# Altium footprint library Lib.PcbLib: 177 footprints (part 5 of 12)
Each footprint in its own frame and in the unit in brackets; x right, y up, seen from the top. Pads: shape width x height; smd on the part's side, far side on the other; paste and mask are expansions set on the pad; w line width, h text height; cw(c..) or ccw(c..) is an arc to the next point about the centre after c.
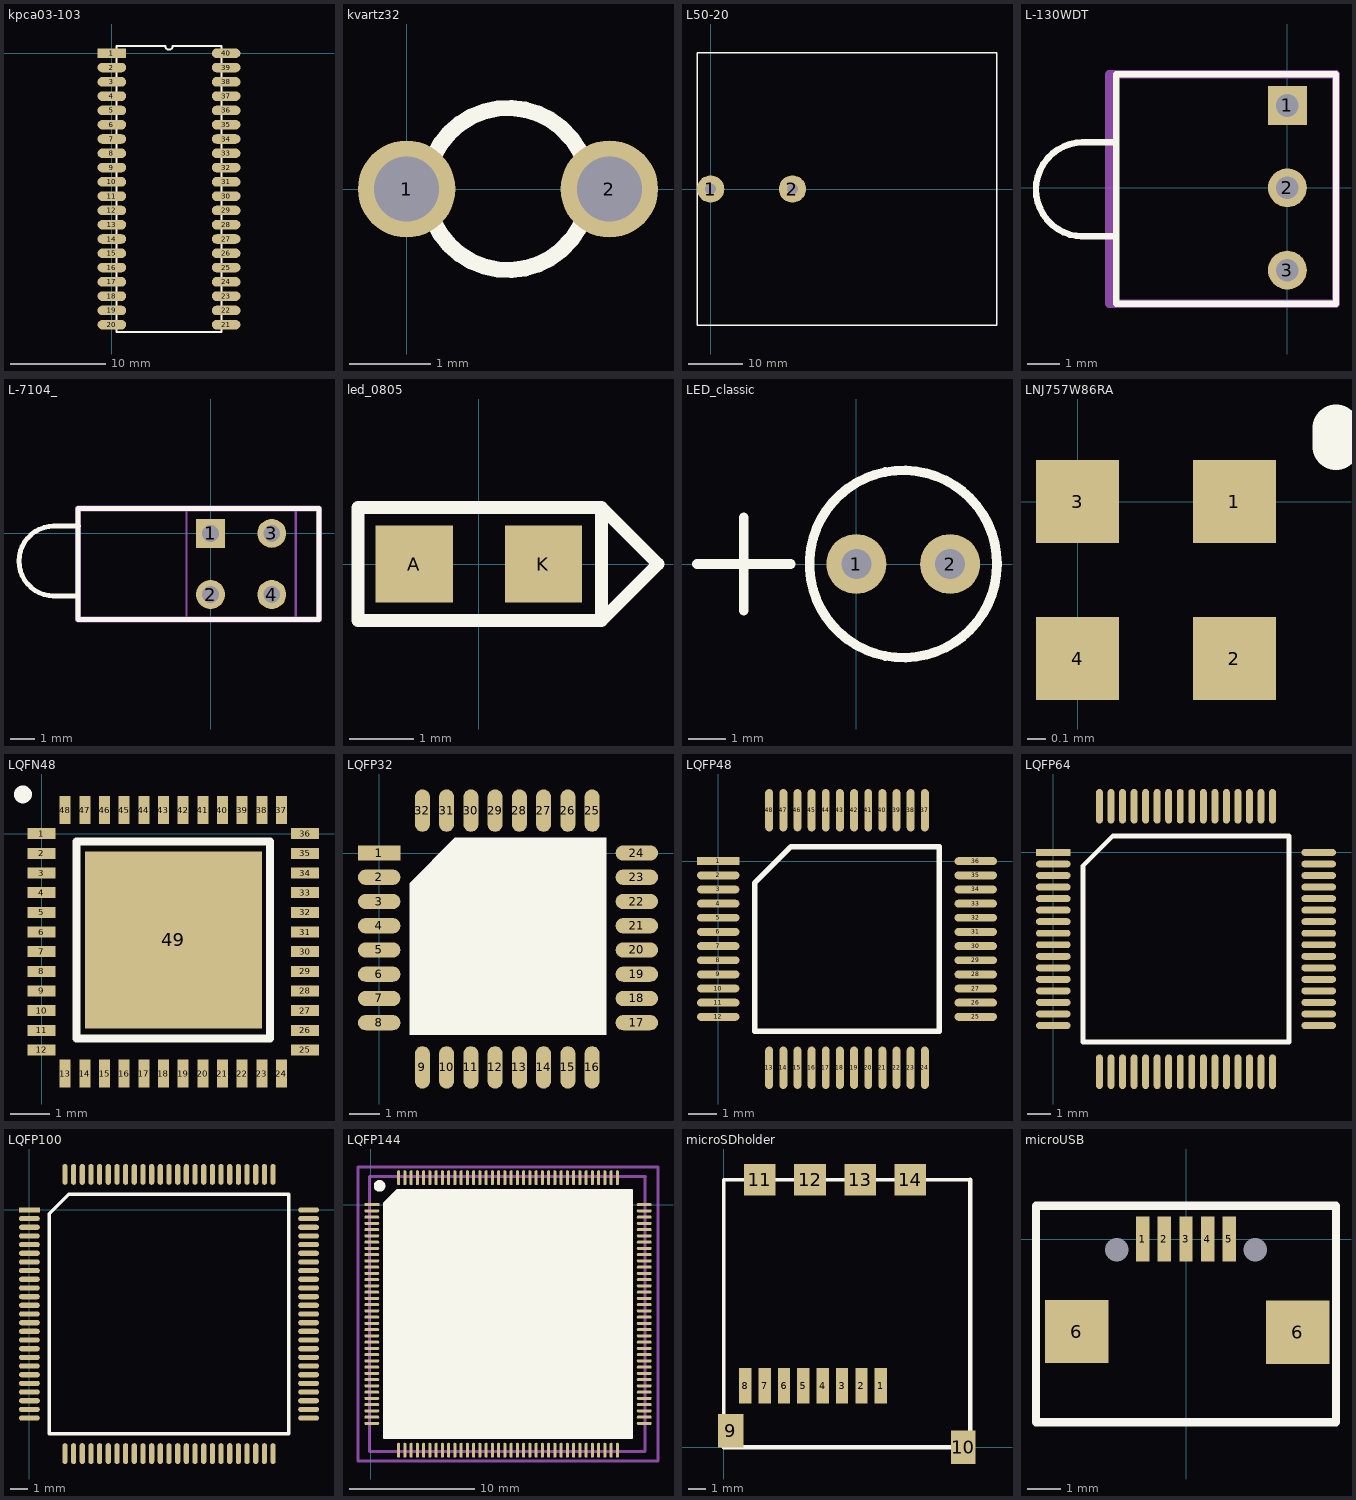
[diagram p4: the footprints below, top view; thin cyan lines are the x and y axes]

## kpca03-103 [mm]
pads (40):
  rect 3x1 smd: 1(0,0)
  oval 3x1 smd: 2(0,-1.5) 3(0,-3) 4(0,-4.5) 5(0,-6) 6(0,-7.5) 7(0,-9) 8(0,-10.5) 9(0,-12) 10(0,-13.5) 11(0,-15) 12(0,-16.5) 13(0,-18) 14(0,-19.5) 15(0,-21) 16(0,-22.5) 17(0,-24) 18(0,-25.5) 19(0,-27) 20(0,-28.5) 21(12,-28.5) 22(12,-27) 23(12,-25.5) 24(12,-24) 25(12,-22.5) 26(12,-21) 27(12,-19.5) 28(12,-18) 29(12,-16.5) 30(12,-15) 31(12,-13.5) 32(12,-12) 33(12,-10.5) 34(12,-9) 35(12,-7.5) 36(12,-6) 37(12,-4.5) 38(12,-3) 39(12,-1.5) 40(12,0)
Top Overlay:
  lines w0.2: 0.5,-29.25 0.5,0.75 5.625,0.75 ccw(c6,0.75) 6.375,0.75 11.5,0.75 11.5,-29.25 0.5,-29.25

## kvartz32 [mm]
pads (2):
  round 1.2 hole 0.8: 1(0,0) 2(2.5,0)
Top Overlay:
  circle w0.2: c1.25,0 r1

## L50-20 [mm]
pads (2):
  round 5 hole 2: 1(0,0) 2(15,0)
Top Overlay:
  lines w0.254: -2.5,-25 52.5,-25 52.5,25 -2.5,25 -2.5,0 -2.5,-25

## L-130WDT [mm]
pads (3):
  rect 1.2x1.2 hole 0.7: 1(0,2.54)
  round 1.2 hole 0.7: 2(0,0) 3(0,-2.54)
Top Overlay:
  lines w0.2: -6.35,-1.5 -5.3,-1.5 ; -6.325,1.4 -5.275,1.4 ; -6.3,-1.5 cw(c-6.3,-0.05) -6.3,1.4 ; -5.275,-3.57 1.5,-3.57 1.5,3.5 -5.275,3.5 -5.275,-3.57
Mechanical 3:
  lines w0.254: -5.5,-3.575 1.5,-3.575 1.5,3.5 -5.5,3.5 -5.5,-3.575
Mechanical 13:
  lines w0.1: -5.275,-3.57 -5.275,3.425 1.5,3.425 1.5,-3.57 -5.275,-3.57
Mechanical 15:
  lines w0.1: -0.4,0 0.4,0 ; 0,-0.4 0,0.4 ; -5.425,-3.57 1.5,-3.57 1.5,3.5 -5.425,3.5 -5.425,-3.57
3D body: height 3.86, standoff 0.97, extent -7.78,-1.447 -5.08,1.447
3D body: height 5, standoff 0, extent -5.08,-3.5 1.27,3.5

## L-7104_ [mm]
pads (4):
  rect 1.2x1.2 hole 0.7: 1(0,0)
  round 1.2 hole 0.7: 2(0,-2.54) 3(2.54,0) 4(2.54,-2.54)
Top Overlay:
  lines w0.2: -6.55,-2.6 -5.5,-2.6 ; -6.525,0.3 -5.475,0.3 ; -6.5,-2.6 cw(c-6.5,-1.15) -6.5,0.3 ; -5.5,-3.57 4.5,-3.57 4.5,1.03 -5.5,1.03 -5.5,-3.57
Mechanical 3:
  lines w0.254: -5.5,-3.575 4.5,-3.575 4.5,1.025 -5.5,1.025 -5.5,-3.575
Mechanical 13:
  lines w0.1: -5.5,-3.57 -5.5,1.03 4.5,1.03 4.5,-3.57 -5.5,-3.57
Mechanical 15:
  lines w0.1: -0.4,0 0.4,0 ; 0,-0.4 0,0.4 ; -1,-3.57 3.54,-3.57 3.54,1.03 -1,1.03 -1,-3.57
3D body "User Library-L-7104MD-2GD.step": height 9.65, standoff -3.68, extent -7.23,-3.45 3.7,0.85

## led_0805 [mm]
pads (2):
  rect 1.2x1.2 smd: A(-1,0) K(1,0)
Top Overlay:
  lines w0.2: 2.75,0 2.775,0 ; 1.9,-0.875 2.775,0 ; 1.9,-0.875 1.9,-0.875 ; 1.9,-0.875 1.9,0.875 ; 1.9,-0.875 -1.875,-0.875 -1.875,-0.437 -1.875,0.437 -1.875,0.875 1.9,0.875 ; 1.9,0.875 2.775,0 ; 1.9,0.875 1.9,0.875
3D body "User Library-led_0805.step": height 1.1, standoff 0, extent -1.01,-0.625 1.01,0.625

## LED_classic [mm]
pads (2):
  round 1.6 hole 0.8: 1(0,0) 2(2.5,0)
Top Overlay:
  circle w0.254: c1.25,0 r2.5
  lines w0.254: -4.25,0 -1.75,0 ; -3,-1.25 -3,1.25
3D body "CircuitWorks-5MM LED RED.step": height 12.6, standoff -1, extent -1.293,-2.55 3.793,2.55

## LNJ757W86RA [mm]
pads (4):
  rect 0.45x0.45 smd: 1(0.85,0) 2(0.85,-0.85) 3(0,0) 4(0,-0.85)
Top Overlay:
  lines w0.254: 1.4,0.3 1.4,0.4
3D body: height 0.25, standoff 0, extent -0.125,-1.075 0.975,0.225

## LQFN48 [mm]
pads (49):
  rect 0.71x0.28 smd: 1(0,0) 2(0,-0.5) 3(0,-1) 4(0,-1.5) 5(0,-2) 6(0,-2.5) 7(0,-3) 8(0,-3.5) 9(0,-4) 10(0,-4.5) 11(0,-5) 12(0,-5.5) 25(6.7,-5.5) 26(6.7,-5) 27(6.7,-4.5) 28(6.7,-4) 29(6.7,-3.5) 30(6.7,-3) 31(6.7,-2.5) 32(6.7,-2) 33(6.7,-1.5) 34(6.7,-1) 35(6.7,-0.5) 36(6.7,0)
  rect 0.28x0.71 smd: 13(0.6,-6.1) 14(1.1,-6.1) 15(1.6,-6.1) 16(2.1,-6.1) 17(2.6,-6.1) 18(3.1,-6.1) 19(3.6,-6.1) 20(4.1,-6.1) 21(4.6,-6.1) 22(5.1,-6.1) 23(5.6,-6.1) 24(6.1,-6.1) 37(6.1,0.6) 38(5.6,0.6) 39(5.1,0.6) 40(4.6,0.6) 41(4.1,0.6) 42(3.6,0.6) 43(3.1,0.6) 44(2.6,0.6) 45(2.1,0.6) 46(1.6,0.6) 47(1.1,0.6) 48(0.6,0.6)
  rect 4.5x4.5 smd: 49(3.35,-2.7)
Top Overlay:
  circle w0.254: c-0.475,1 r0.1
  lines w0.2: 0.89,-5.21 5.81,-5.21 5.81,-0.2 0.89,-0.2 0.89,-5.21
3D body "User Library-QFN48_7x7.step": height 0.78, standoff -0.02, extent -0.17,-6.275 6.85,0.745

## LQFP32 [mm]
pads (32):
  rect 1.4x0.5 smd: 1(0,0)
  oval 1.4x0.5 smd: 2(0,-0.8) 3(0,-1.6) 4(0,-2.4) 5(0,-3.2) 6(0,-4) 7(0,-4.8) 8(0,-5.6) 17(8.5,-5.6) 18(8.5,-4.8) 19(8.5,-4) 20(8.5,-3.2) 21(8.5,-2.4) 22(8.5,-1.6) 23(8.5,-0.8) 24(8.5,0)
  oval 0.5x1.4 smd: 9(1.425,-7.075) 10(2.225,-7.075) 11(3.025,-7.075) 12(3.825,-7.075) 13(4.625,-7.075) 14(5.425,-7.075) 15(6.225,-7.075) 16(7.025,-7.075) 25(7.025,1.4) 26(6.225,1.4) 27(5.425,1.4) 28(4.625,1.4) 29(3.825,1.4) 30(3.025,1.4) 31(2.225,1.4) 32(1.425,1.4)
Top Overlay:
  region: 1,-6 1,-1 2.5,0.5 7.5,0.5 7.5,-6
3D body "SW3dPS-LQFP32.STEP": height 1.63, standoff -0.09, extent -0.25,-7.3 8.75,1.7

## LQFP48 [mm]
height 1
pads (48):
  rect 1.5x0.28 smd: 1(0,0)
  oval 1.5x0.28 smd: 2(0,-0.5) 3(0,-1) 4(0,-1.5) 5(0,-2) 6(0,-2.5) 7(0,-3) 8(0,-3.5) 9(0,-4) 10(0,-4.5) 11(0,-5) 12(0,-5.5) 25(9.1,-5.5) 26(9.1,-5) 27(9.1,-4.5) 28(9.1,-4) 29(9.1,-3.5) 30(9.1,-3) 31(9.1,-2.5) 32(9.1,-2) 33(9.1,-1.5) 34(9.1,-1) 35(9.1,-0.5) 36(9.1,0)
  oval 0.28x1.5 smd: 13(1.8,-7.3) 14(2.3,-7.3) 15(2.8,-7.3) 16(3.3,-7.3) 17(3.8,-7.3) 18(4.3,-7.3) 19(4.8,-7.3) 20(5.3,-7.3) 21(5.8,-7.3) 22(6.3,-7.3) 23(6.8,-7.3) 24(7.3,-7.3) 37(7.3,1.8) 38(6.8,1.8) 39(6.3,1.8) 40(5.8,1.8) 41(5.3,1.8) 42(4.8,1.8) 43(4.3,1.8) 44(3.8,1.8) 45(3.3,1.8) 46(2.8,1.8) 47(2.3,1.8) 48(1.8,1.8)
Top Overlay:
  lines w0.2: 1.285,-6.015 1.285,-0.77 2.57,0.515 7.815,0.515 7.815,-6.015 1.285,-6.015
3D body "User Library-LQFP48_Grid_0_5.STEP": height 1.6, standoff 0, extent 0.075,-7.25 9.075,1.75

## LQFP64 [mm]
height 2
pads (64):
  rect 1.5x0.3 smd: 1(0,0)
  oval 1.5x0.3 smd: 2(0,-0.5) 3(0,-1) 4(0,-1.5) 5(0,-2) 6(0,-2.5) 7(0,-3) 8(0,-3.5) 9(0,-4) 10(0,-4.5) 11(0,-5) 12(0,-5.5) 13(0,-6) 14(0,-6.5) 15(0,-7) 16(0,-7.5) 33(11.5,-7.5) 34(11.5,-7) 35(11.5,-6.5) 36(11.5,-6) 37(11.5,-5.5) 38(11.5,-5) 39(11.5,-4.5) 40(11.5,-4) 41(11.5,-3.5) 42(11.5,-3) 43(11.5,-2.5) 44(11.5,-2) 45(11.5,-1.5) 46(11.5,-1) 47(11.5,-0.5) 48(11.5,0)
  oval 0.3x1.5 smd: 17(2,-9.5) 18(2.5,-9.5) 19(3,-9.5) 20(3.5,-9.5) 21(4,-9.5) 22(4.5,-9.5) 23(5,-9.5) 24(5.5,-9.5) 25(6,-9.5) 26(6.5,-9.5) 27(7,-9.5) 28(7.5,-9.5) 29(8,-9.5) 30(8.5,-9.5) 31(9,-9.5) 32(9.5,-9.5) 49(9.5,2) 50(9,2) 51(8.5,2) 52(8,2) 53(7.5,2) 54(7,2) 55(6.5,2) 56(6,2) 57(5.5,2) 58(5,2) 59(4.5,2) 60(4,2) 61(3.5,2) 62(3,2) 63(2.5,2) 64(2,2)
Top Overlay:
  lines w0.2: 1.285,-8.215 1.285,-0.57 2.57,0.715 10.215,0.715 10.215,-8.215 1.285,-8.215
3D body "User Library-STM32F107 -LQFP64 10mm x 10mm.STEP": height 1.6, standoff 0.01, extent -0.274,-9.749 11.724,2.249

## LQFP100 [mm]
pads (100):
  rect 1.2x0.3 smd: 1(0,0)
  oval 1.2x0.3 smd: 2(0,-0.5) 3(0,-1) 4(0,-1.5) 5(0,-2) 6(0,-2.5) 7(0,-3) 8(0,-3.5) 9(0,-4) 10(0,-4.5) 11(0,-5) 12(0,-5.5) 13(0,-6) 14(0,-6.5) 15(0,-7) 16(0,-7.5) 17(0,-8) 18(0,-8.5) 19(0,-9) 20(0,-9.5) 21(0,-10) 22(0,-10.5) 23(0,-11) 24(0,-11.5) 25(0,-12) 51(16.1,-12) 52(16.1,-11.5) 53(16.1,-11) 54(16.1,-10.5) 55(16.1,-10) 56(16.1,-9.5) 57(16.1,-9) 58(16.1,-8.5) 59(16.1,-8) 60(16.1,-7.5) 61(16.1,-7) 62(16.1,-6.5) 63(16.1,-6) 64(16.1,-5.5) 65(16.1,-5) 66(16.1,-4.5) 67(16.1,-4) 68(16.1,-3.5) 69(16.1,-3) 70(16.1,-2.5) 71(16.1,-2) 72(16.1,-1.5) 73(16.1,-1) 74(16.1,-0.5) 75(16.1,0)
  oval 0.3x1.2 smd: 26(2.05,-14.05) 27(2.55,-14.05) 28(3.05,-14.05) 29(3.55,-14.05) 30(4.05,-14.05) 31(4.55,-14.05) 32(5.05,-14.05) 33(5.55,-14.05) 34(6.05,-14.05) 35(6.55,-14.05) 36(7.05,-14.05) 37(7.55,-14.05) 38(8.05,-14.05) 39(8.55,-14.05) 40(9.05,-14.05) 41(9.55,-14.05) 42(10.05,-14.05) 43(10.55,-14.05) 44(11.05,-14.05) 45(11.55,-14.05) 46(12.05,-14.05) 47(12.55,-14.05) 48(13.05,-14.05) 49(13.55,-14.05) 50(14.05,-14.05) 76(14.05,2.05) 77(13.55,2.05) 78(13.05,2.05) 79(12.55,2.05) 80(12.05,2.05) 81(11.55,2.05) 82(11.05,2.05) 83(10.55,2.05) 84(10.05,2.05) 85(9.55,2.05) 86(9.05,2.05) 87(8.55,2.05) 88(8.05,2.05) 89(7.55,2.05) 90(7.05,2.05) 91(6.55,2.05) 92(6.05,2.05) 93(5.55,2.05) 94(5.05,2.05) 95(4.55,2.05) 96(4.05,2.05) 97(3.55,2.05) 98(3.05,2.05) 99(2.55,2.05) 100(2.05,2.05)
Top Overlay:
  lines w0.2: 1.135,-12.915 1.135,-0.22 2.27,0.915 14.965,0.915 14.965,-12.915 1.135,-12.915
3D body "User Library-LQFP100.step": height 1.6, standoff 0, extent 0.05,-14 16.05,2

## LQFP144 [mm]
pads (144):
  rect 1.2x0.25 smd: 1(0.1,0)
  oval 1.2x0.25 smd: 2(0.1,-0.5) 3(0.1,-1) 4(0.1,-1.5) 5(0.1,-2) 6(0.1,-2.5) 7(0.1,-3) 8(0.1,-3.5) 9(0.1,-4) 10(0.1,-4.5) 11(0.1,-5) 12(0.1,-5.5) 13(0.1,-6) 14(0.1,-6.5) 15(0.1,-7) 16(0.1,-7.5) 17(0.1,-8) 18(0.1,-8.5) 19(0.1,-9) 20(0.1,-9.5) 21(0.1,-10) 22(0.1,-10.5) 23(0.1,-11) 24(0.1,-11.5) 25(0.1,-12) 26(0.1,-12.5) 27(0.1,-13) 28(0.1,-13.5) 29(0.1,-14) 30(0.1,-14.5) 31(0.1,-15) 32(0.1,-15.5) 33(0.1,-16) 34(0.1,-16.5) 35(0.1,-17) 36(0.1,-17.5) 73(21.9,-17.5) 74(21.9,-17) 75(21.9,-16.5) 76(21.9,-16) 77(21.9,-15.5) 78(21.9,-15) 79(21.9,-14.5) 80(21.9,-14) 81(21.9,-13.5) 82(21.9,-13) 83(21.9,-12.5) 84(21.9,-12) 85(21.9,-11.5) 86(21.9,-11) 87(21.9,-10.5) 88(21.9,-10) 89(21.9,-9.5) 90(21.9,-9) 91(21.9,-8.5) 92(21.9,-8) 93(21.9,-7.5) 94(21.9,-7) 95(21.9,-6.5) 96(21.9,-6) 97(21.9,-5.5) 98(21.9,-5) 99(21.9,-4.5) 100(21.9,-4) 101(21.9,-3.5) 102(21.9,-3) 103(21.9,-2.5) 104(21.9,-2) 105(21.9,-1.5) 106(21.9,-1) 107(21.9,-0.5) 108(21.9,0)
  oval 0.25x1.2 smd: 37(2.25,-19.65) 38(2.75,-19.65) 39(3.25,-19.65) 40(3.75,-19.65) 41(4.25,-19.65) 42(4.75,-19.65) 43(5.25,-19.65) 44(5.75,-19.65) 45(6.25,-19.65) 46(6.75,-19.65) 47(7.25,-19.65) 48(7.75,-19.65) 49(8.25,-19.65) 50(8.75,-19.65) 51(9.25,-19.65) 52(9.75,-19.65) 53(10.25,-19.65) 54(10.75,-19.65) 55(11.25,-19.65) 56(11.75,-19.65) 57(12.25,-19.65) 58(12.75,-19.65) 59(13.25,-19.65) 60(13.75,-19.65) 61(14.25,-19.65) 62(14.75,-19.65) 63(15.25,-19.65) 64(15.75,-19.65) 65(16.25,-19.65) 66(16.75,-19.65) 67(17.25,-19.65) 68(17.75,-19.65) 69(18.25,-19.65) 70(18.75,-19.65) 71(19.25,-19.65) 72(19.75,-19.65) 109(19.75,2.15) 110(19.25,2.15) 111(18.75,2.15) 112(18.25,2.15) 113(17.75,2.15) 114(17.25,2.15) 115(16.75,2.15) 116(16.25,2.15) 117(15.75,2.15) 118(15.25,2.15) 119(14.75,2.15) 120(14.25,2.15) 121(13.75,2.15) 122(13.25,2.15) 123(12.75,2.15) 124(12.25,2.15) 125(11.75,2.15) 126(11.25,2.15) 127(10.75,2.15) 128(10.25,2.15) 129(9.75,2.15) 130(9.25,2.15) 131(8.75,2.15) 132(8.25,2.15) 133(7.75,2.15) 134(7.25,2.15) 135(6.75,2.15) 136(6.25,2.15) 137(5.75,2.15) 138(5.25,2.15) 139(4.75,2.15) 140(4.25,2.15) 141(3.75,2.15) 142(3.25,2.15) 143(2.75,2.15) 144(2.25,2.15)
Top Overlay:
  circle w0.5: c0.725,1.5 r0.215
  rectangle: 2.17,-18.665 20.915,1.165
  region: 2.17,1.165 1.085,0.08 1.085,-18.665 2.17,-18.665
  lines w0.2: 1.085,-18.665 20.915,-18.665 20.915,1.165 2.17,1.165 1.085,0.08 1.085,-18.665
Mechanical 3:
  lines w0.254: -0.075,-19.725 -0.075,2.25 21.975,2.25 21.95,2.225 21.95,-19.75 -0.05,-19.75 -0.075,-19.725
Mechanical 11:
  lines w0.254: -1,-20.5 -1,3 23,3 23,-20.5 -1,-20.5
Mechanical 13:
  circle w0.1: c2.5,0 r1.118
  lines w0.1: -0.025,-19.775 -0.025,2.225 21.975,2.225 21.975,-19.775 -0.025,-19.775
3D body "User Library-LQFP144_STM32F4.STEP": height 1.9, standoff 0, extent -0.025,-19.775 21.975,2.225

## microSDholder [mm]
pads (14):
  rect 0.7x2 smd: 1(8.92,3.5) 2(7.82,3.5) 3(6.72,3.5) 4(5.62,3.5) 5(4.52,3.5) 6(3.42,3.5) 7(2.32,3.5) 8(1.22,3.5)
  rect 1.45x1.9 smd: 9(0.4,0.95)
  rect 1.4x1.9 smd: 10(13.6,0)
  rect 1.8x1.8 smd: 11(2.05,15.2) 12(4.9,15.2) 13(7.75,15.2) 14(10.6,15.2)
Top Overlay:
  lines w0.2: 0,0 0,15.2 14,15.2
  lines w0.254: 0,0 14,0 14,15.2

## microUSB [mm]
height 3
pads (9):
  rect 0.4x1.35 smd: 1(-1.3,0) 2(-0.65,0) 3(0,0) 4(0.65,0) 5(1.3,0)
  rect 1.9x1.9 smd: 6(-3.275,-2.775) 6(3.35,-2.8)
  round 0.2 hole 0.7: 6(-2.075,-0.325) 6(2.075,-0.325)
Top Overlay:
  lines w0.254: -4.5,-5.5 -4.5,0.5 -4.5,1 4.5,1 4.5,-5.5 -4.5,-5.5
3D body "65944.stp": height 2.7, standoff -0.6, extent -4,-5.669 4,0.375